# Altium integrated library chipfc_altium_libs.IntLib: 346 symbols (part 1 of 3) (continued)
## LM358
designator U?
Low Power Dual Operational Amplifiers
footprint DIP 8 (DIP IC (2.54mm), 8 pins)
footprint SOIC-8 (SOIC, 8-Leads, Body 5.0x4.0mm (max), Pitch 1.27mm, IPC Medium Density)
part A pins: 1 OutA, 2 A-, 3 A+, 4 GND hidden to GND, 8 VCC hidden to VCC
part B pins: 5 B+, 6 B-, 7 OutB

## LM2596S-5.0
designator U?
Simple Switcher 3A Step-Down Voltage Regulator
footprint TO-263-5 (D2-PAK, 6-Pads, Body 8.9x10.4mm (max), IPC Medium Density)
pins: 1 VIN, 2 Out, 3 GND, 4 FB, 5 ~{ON}/OFF, 6 PAD
text: ON/OFF

## LP2985-33DBVR
designator U?  PACKAGE: SOT23-5
IC REG LDO 3.3V 0.15A SOT23-5; TYPE: SMD
footprint SOT-23-5 (SOT23, 5-Leads, Body 3.0x3.0mm (max), Pitch 0.95mm, IPC Medium Density)
pins: 1 VIN, 2 GND, 3 EN, 4 NR/FB, 5 VOUT

## M95
designator U?
Quectel's Cellular Engine
footprint M95 (LCC, 54-Pins, Body 19.9x23.6mm (max), Pitch 1.10mm, IPC Medium Density)
footprint M95 2 (LCC, 54-Pins, Body 19.9x23.6mm (max), Pitch 1.10mm, IPC Medium Density)
pins: 1 AGND (power), 2 MIC2P (in), 3 MIC2N (in), 4 MIC1P (in), 5 MIC1N (in), 6 SPK1N (out), 7 SPK1P (out), 8 LOUDSPKN (out), 9 LOUDSPKP (out), 10 PWRKEY (in), 11 EMERG_OFF (in), 12 STATUS (out), 13 NETLIGHT (out), 14 DBG_RXD (in), 15 DBG_TXD (out), 16 RESERVED, 17 RESERVED, 18 RESERVED, 19 VDD_EXT (power), 20 DTR (in), 21 RXD (in), 22 TXD (out), 23 CTS (out), 24 RTS (in), 25 DCD (out), 26 RI (out), 27 SIM_VDD (power), 28 SIM_RST (out), 29 SIM_DATA (io), 30 SIM_CLK (out), 31 SIM_GND (power), 32 VRTC (power), 33 VBAT (power), 34 VBAT (power), 35 GND (power), 36 GND (power), 37 GND (power), 38 GND (power), 39 RF_ANT, 40 GND (power)

## MAX232
designator U?
RS-232 Line Driver/Receiver
footprint SOIC-16 (SOIC, 16-Leads, Body 10.0x4.0mm (max), Pitch 1.27mm, IPC Medium Density)
pins: 1 C1+, 2 V+, 3 C1-, 4 C2+, 5 C2-, 6 V-, 7 DOUT2, 8 RIN2, 9 ROUT2, 10 DIN2, 11 DIN1, 12 ROUT1, 13 RIN1, 14 DOUT1, 15 GND, 16 VCC

## MC34063A
designator U?
1.5A peak Boost/Buck/Inverting switching regulator
footprint SOIC-8 (SOIC, 8-Leads, Body 5.0x4.0mm (max), Pitch 1.27mm, IPC Medium Density)
pins: 1 SWC, 2 SWE, 3 TC, 4 GND, 5 COMP, 6 VCC, 7 SEN, 8 DVR

## MCP17xx
designator U?
pins: 1 GND (power), 2 VOUT (power), 3 VIN (power)

## MCP2021
designator U?, comment MCP2021(A)
LIN Transceiver with Voltage Regulator
footprint SOIC-8 (SOIC, 8-Leads, Body 5.0x4.0mm (max), Pitch 1.27mm, IPC Medium Density)
pins: 1 RXD (out), 2 CS/LWAKE (in), 3 VRegOut (power), 4 TXD (in), 5 VSS (power), 6 Lbus (io), 7 VBB (power), 8 ~{Fault}/TXE (io)

## MCP2515-SO
designator U?
Stand-Alone CAN Controller with SPI Interface
footprint SOIC-20 (SOIC, 20-Leads, Body 12.8x7.5mm (max), Pitch 1.27mm, IPC Medium Density)
pins: 1 TXCAN, 2 RXCAN, 3 CLKOUT/SOF, 4 ~{TX0RTS}, 5 ~{TX1RTS}, 6 ~{TX2RTS}, 7 OSC2, 8 OSC1, 9 VSS, 10 ~{RX1BF}, 11 ~{RX0BF}, 12 ~{INT}, 13 SCK, 14 SI, 15 SO, 16 ~{CS}, 17 ~{RESET}, 18 VDD

## MCP2551
designator U?
High-Speed CANTransceiver
footprint SOIC-8 (SOIC, 8-Leads, Body 5.0x4.0mm (max), Pitch 1.27mm, IPC Medium Density)
footprint DIP 8 (DIP IC (2.54mm), 8 pins)
pins: 1 TXD (in), 2 VSS (power), 3 VDD (power), 4 RXD (out), 5 Vref (out), 6 CANL (io), 7 CANH (io), 8 Rs (in)

## MCP9700
designator Q?, comment MCP9700A
Low-Power Linear Active Thermistor™ ICs
footprint TO-92
footprint SOT-23 (SOT23, 3-Leads, Body 3.0x2.5mm (max), Pitch 0.95mm, IPC Medium Density)
footprint TO-92/W100
pins: 1 VDD, 2 VOUT, 3 GND

## MCP73831/2
designator U?
Miniature Single-Cell, Fully Integrated Li-Ion, Li-Polymer Charge Management Controllers
footprint SOT-23-5 (SOT23, 5-Leads, Body 3.0x3.0mm (max), Pitch 0.95mm, IPC Medium Density)
pins: 1 Stat, 2 Vss, 3 Vbat, 4 Vdd, 5 Prog

## MIC29302WT
designator U?
3.0A LDO Regulator with ADJ. voltage output
footprint TO-263-5 (D2-PAK, 6-Pads, Body 8.9x10.4mm (max), IPC Medium Density)
pins: 1 EN, 2 IN, 3 GND, 4 OUT, 5 ADJ, 6 TAB(GND)

## MMA845xQ
designator U?
Freescale's 3-axis digital accelerometer
footprint MMA845xQ (QFN, 16-Leads, Body 3.0x3.0mm (max), Pitch 0.50mm, IPC Low Density)
pins: 1 VDDIO, 2 BYP, 4 SCL, 5 GND, 6 SDA, 7 SA0, 9 INT2, 10 GND, 11 INT1, 12 GND, 14 VDD

## MMA7260Q
designator U?
pins: 1 GS1, 2 GS2, 3 VDD (power), 4 VSS (power), 12 ~{SLP}, 13 Zout, 14 Yout, 15 Xout

## MMA7455L
designator U?
±2g/±4g/±8g Three Axis Low-g Digital Output Accelerometer
footprint LGA-14 (LCC, 14-Pins, Body 3.0x5.0mm (max), Pitch 0.80mm, IPC Medium Density)
pins: 1 DVDD, 2 GND, 3 NC, 4 IADDR0, 5 GND, 6 AVDD, 7 ~{CS}, 8 INT1/DRDY, 9 INT2, 10 NC, 11 NC, 12 SDO, 13 SDA/SDI/3WSDO, 14 SCL/SPC

## Mosfet N
designator Q?
footprint SOT-23 (SOT23, 3-Leads, Body 3.0x2.5mm (max), Pitch 0.95mm, IPC Medium Density)
footprint TO-220; pin to pad 2>3 3>2
footprint SOIC-8 (SOIC, 8-Leads, Body 5.0x4.0mm (max), Pitch 1.27mm, IPC Medium Density); pin to pad 1>4 2>1+2+3 3>5+6+7+8
footprint TO-220/HeatSink; pin to pad 2>3 3>2
footprint TO-252 (DPAK) (D-PAK, 3-Pads, Body 6.2x6.7mm (max), IPC Medium Density); pin to pad 2>3 3>2
footprint TO-263 (D2PAK); pin to pad 2>3 3>2
pins: 1 G, 2 S, 3 D

## Mosfet P
designator Q?
footprint SOT-23 (SOT23, 3-Leads, Body 3.0x2.5mm (max), Pitch 0.95mm, IPC Medium Density)
footprint TO-220; pin to pad 2>3 3>2
footprint TO-220/HeatSink; pin to pad 2>3 3>2
footprint SOIC-8 (SOIC, 8-Leads, Body 5.0x4.0mm (max), Pitch 1.27mm, IPC Medium Density); pin to pad 1>4 2>1+2+3 3>5+6+7+8
footprint TO-252 (DPAK) (D-PAK, 3-Pads, Body 6.2x6.7mm (max), IPC Medium Density); pin to pad 2>3 3>2
footprint TO-263 (D2PAK); pin to pad 2>3 3>2
pins: 1 G, 2 S, 3 D

## MPL115A2
designator U?
pins: 1 VDD, 2 CAP, 3 GND, 4 SHDN, 5 RST, 6 NC, 7 SDA, 8 SCL

## MPU-6050
designator U?
Accelerometer, Gyroscope, 6 Axis Sensor IÂ²C Output; MF: TDK InvenSense; Price: None; Package: VFQFN-24 TDK InvenSense; MP: MPU-6050; Value: *; Availability: Unavailable; SnapEDA_Link: https://www.snapeda.com/parts/MPU-6050/TDK%20InvenSense/view-part/4503180/?ref=snap
footprint QFN 50P 24 400X400X95
pins: 1 CLKIN (in), 6 AUX_DA (io), 7 AUX_CL (in), 8 VLOGIC (power), 9 AD0 (in), 10 REGOUT, 11 FSYNC (in), 12 INT (out), 13 VDD (power), 18 GND (power), 19 RESV@1, 20 CPOUT, 21 RESV@2, 22 RESV, 23 SCL (in), 24 SDA (io)

## MSP430F1612IPM
designator U?, comment MSP430F1612
footprint QFP 50P 64 (TSQFP, 64-Leads, Body 12.0x12.0mm (max), Pitch 0.50mm, IPC Medium Density)
pins: 1 DVCC (power), 2 P6.3/A3 (io), 3 P6.4/A4 (io), 4 P6.5/A5 (io), 5 P6.6/A6/DAC0 (io), 6 P6.7/A7/DAC1/ SVSIN (io), 7 VREF+ (out), 8 XIN (in), 9 XOUT (out), 10 VeREF+ (in), 11 VREF-/VeREF- (in), 12 P1.0/TACLK (io), 13 P1.1/TA0 (io), 14 P1.2/TA1 (io), 15 P1.3/TA2 (io), 16 P1.4/SMCLK (io), 17 P1.5/TA0 (io), 18 P1.6/TA1 (io), 19 P1.7/TA2 (io), 20 P2.0/ACLK (io), 21 P2.1/TAINCLK (io), 22 P2.2/CAOUT/TA0 (io), 23 P2.3/CA0/TA1 (io), 24 P2.4/CA1/TA2 (io), 25 P2.5/ROSC (io), 26 P2.6/ADC12CLK/ DMAE0 (io), 27 P2.7/TA0 (io), 28 P3.0/STE0 (io), 29 P3.1/SIMO0/SDA (io), 30 P3.2/SOMI0 (io), 31 P3.3/UCLK0/SCL (io), 32 P3.4/UTXD0 (io), 33 P3.5/URXD0 (io), 34 P3.6/UTXD1 (io), 35 P3.7/URXD1 (io), 36 P4.0/TB0 (io), 37 P4.1/TB1 (io), 38 P4.2/TB2 (io), 39 P4.3/TB3 (io), 40 P4.4/TB4 (io), 41 P4.5/TB5 (io), 42 P4.6/TB6 (io), 43 P4.7/TBCLK (io), 44 P5.0/STE1 (io), 45 P5.1/SIMO1 (io), 46 P5.2/SOMI1 (io), 47 P5.3/UCLK1 (io), 48 P5.4/MCLK (io), 49 P5.5/SMCLK (io), 50 P5.6/ACLK (io), 51 P5.7/TBOUTH/ SVSOUT (io), 52 XT2OUT (out), 53 XT2IN (in), 54 TDO/TDI (io), 55 TDI (in), 56 TMS (in), 57 TCK (in), 58 ~{RST}/NMI (in), 59 P6.0/A0 (io), 60 P6.1/A1 (io), 61 P6.2/A2 (io), 62 AVSS (power), 63 DVSS (power), 64 AVCC (power)

## MSP430F2618TPMR
designator U?
footprint QFP 50P 64 (TSQFP, 64-Leads, Body 12.0x12.0mm (max), Pitch 0.50mm, IPC Medium Density)
pins: 1 DVCC (power), 2 P6.3/A3 (io), 3 P6.4/A4 (io), 4 P6.5/A5 (io), 5 P6.6/A6 (io), 6 P6.7/A7/SVSIN (io), 7 VREF+ (out), 8 XIN (in), 9 XOUT (out), 10 VeREF+/DAC0 (in), 11 VREF-/VeREF- (in), 12 P1.0/TACLK/CAOUT (io), 13 P1.1/TA0 (io), 14 P1.2/TA1 (io), 15 P1.3/TA2 (io), 16 P1.4/SMCLK (io), 17 P1.5/TA0 (io), 18 P1.6/TA1 (io), 19 P1.7/TA2 (io), 20 P2.0/ACLK/CA2 (io), 21 P2.1/TAINCLK/CA3 (io), 22 P2.2/CAOUT/TA0/CA4 (io), 23 P2.3/CA0/TA1 (io), 24 P2.4/CA1/TA2 (io), 25 P2.5/ROSC/CA5 (io), 26 P2.6/ADC12CLK/CA6 (io), 27 P2.7/TA0/CA7 (io), 28 P3.0/UCB0STE/UCA0CLK (io), 29 P3.1/UCB0SIMO/UCB0SDA (io), 30 P3.2/UCB0SOMI/UCB0SCL (io), 31 P3.3/UCB0CLK/UCA0STE (io), 32 P3.4/UCA0TXD/UCA0SIMO (io), 33 P3.5/UCA0RXD/UCA0SOMI (io), 34 P3.6/UCA1TXD/UCA1SIMO (io), 35 P3.7/UCA1RXD/UCA1SOMI (io), 36 P4.0/TB0 (io), 37 P4.1/TB1 (io), 38 P4.2/TB2 (io), 39 P4.3/TB3 (io), 40 P4.4/TB4 (io), 41 P4.5/TB5 (io), 42 P4.6/TB6 (io), 43 P4.7/TBCLK (io), 44 P5.0/UCB1STE/UCA1CLK (io), 45 P5.1/UCB1SIMO/UCB1SDA (io), 46 P5.2/UCB1SOMI/UCB1SCL (io), 47 P5.3/UCB1CLK/UCA1STE (io), 48 P5.4/MCLK (io), 49 P5.5/SMCLK (io), 50 P5.6/ACLK (io), 51 P5.7/TBOUTH/SVSOUT (io), 52 XT2OUT (out), 53 XT2IN (in), 54 TDO/TDI (io), 55 TDI/TCLK (in), 56 TMS (in), 57 TCK (in), 58 ~{RST}/NMI (in), 59 P6.0/A0 (io), 60 P6.1/A1 (io), 61 P6.2/A2 (io), 62 AVSS (power), 63 DVSS (power), 64 AVCC (power)

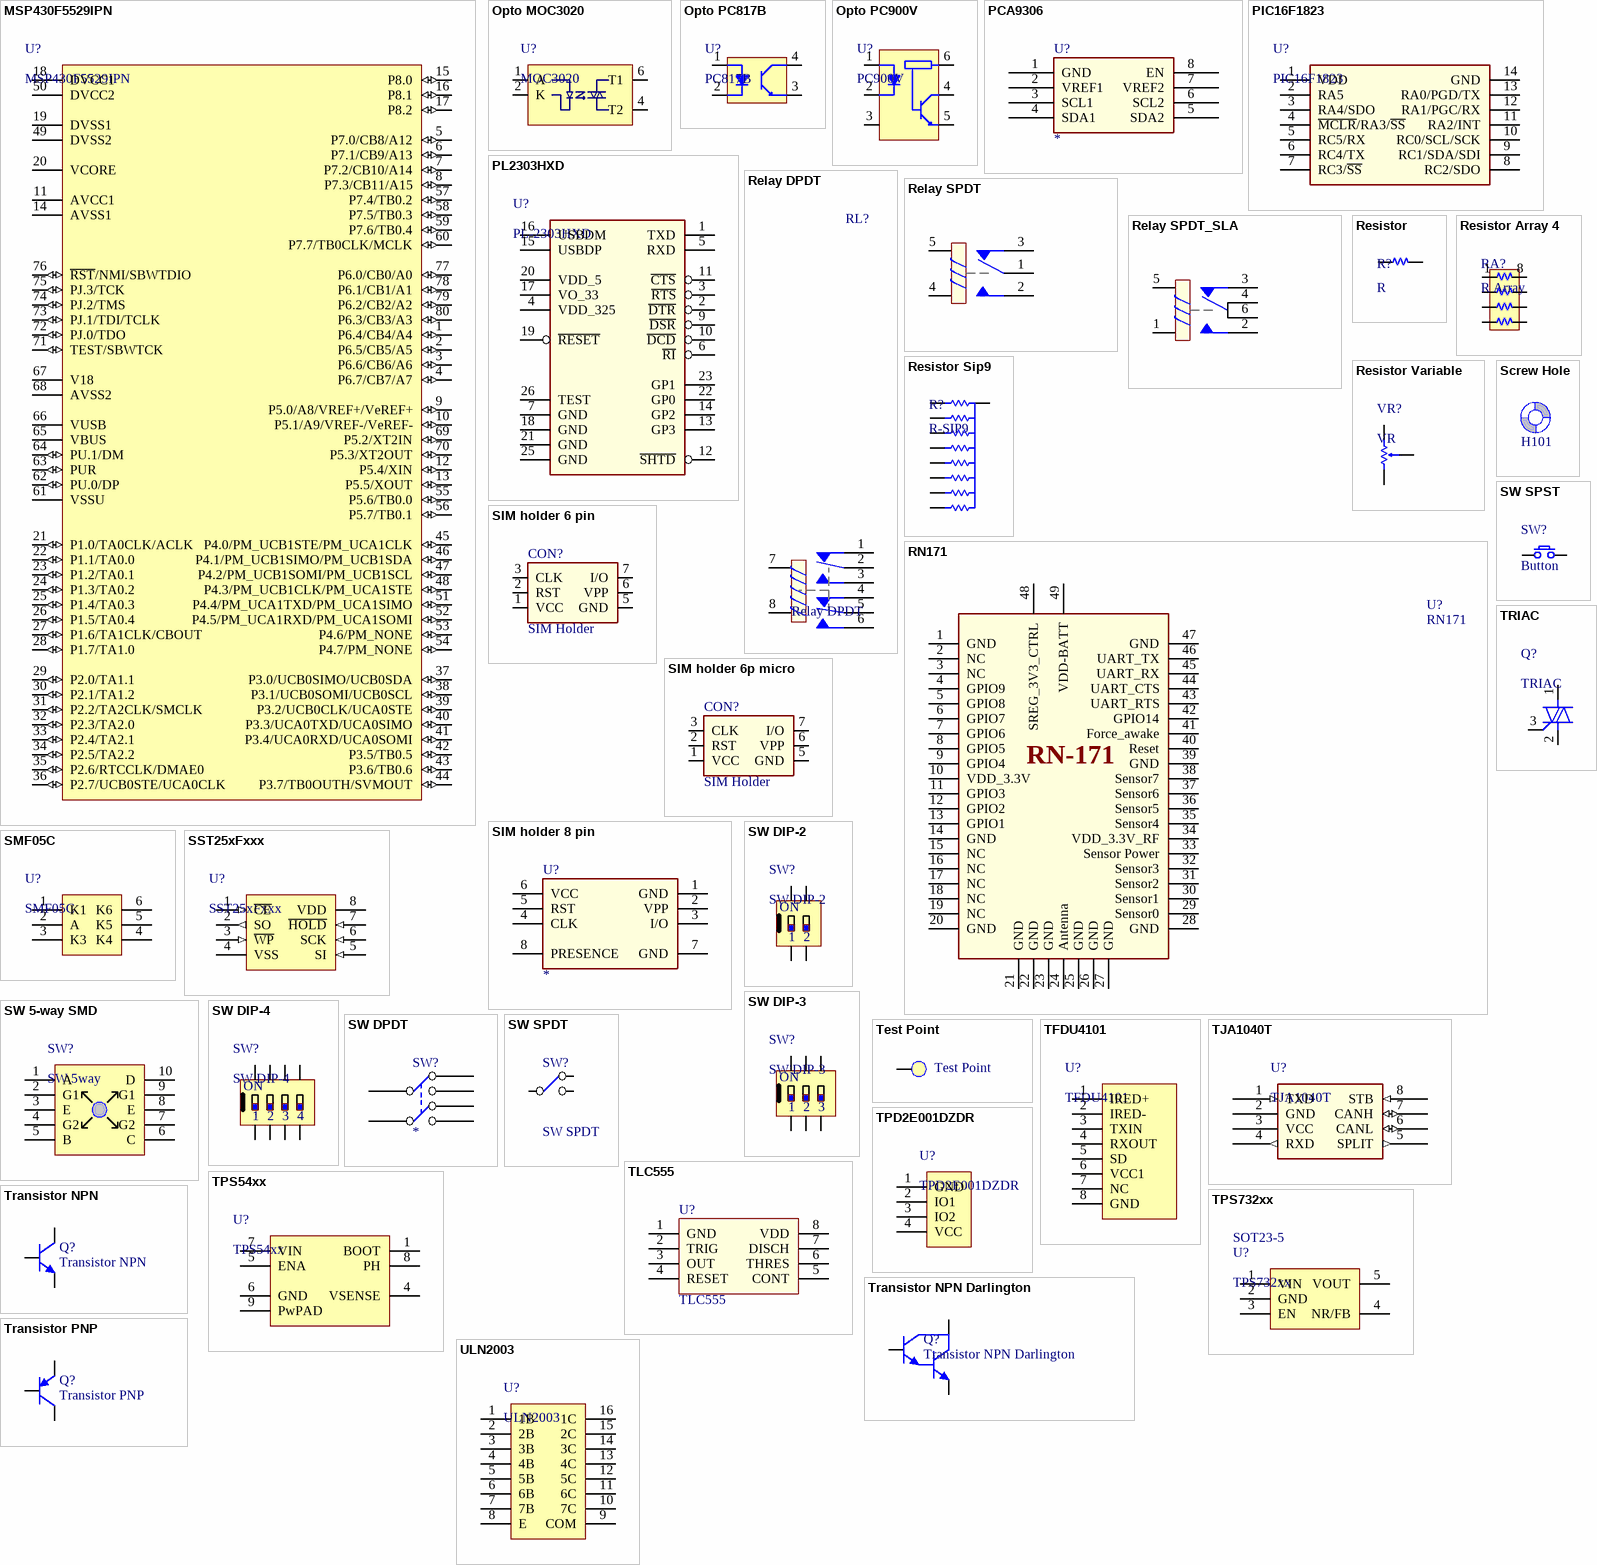
[diagram p3: symbols MSP430F5529IPN to ULN2003]

## MSP430F5529IPN
designator U?
footprint QFP 50P 80 (TSQFP, 80-Leads, Body 14.2x14.2mm (max), Pitch 0.50mm, IPC Medium Density)
pins: 1 P6.4/CB4/A4 (io), 2 P6.5/CB5/A5 (io), 3 P6.6/CB6/A6 (io), 4 P6.7/CB7/A7 (io), 5 P7.0/CB8/A12 (io), 6 P7.1/CB9/A13 (io), 7 P7.2/CB10/A14 (io), 8 P7.3/CB11/A15 (io), 9 P5.0/A8/VREF+/VeREF+ (io), 10 P5.1/A9/VREF-/VeREF- (io), 11 AVCC1 (power), 12 P5.4/XIN (io), 13 P5.5/XOUT (io), 14 AVSS1 (power), 15 P8.0 (io), 16 P8.1 (io), 17 P8.2 (io), 18 DVCC1 (power), 19 DVSS1 (power), 20 VCORE (power), 21 P1.0/TA0CLK/ACLK (io), 22 P1.1/TA0.0 (io), 23 P1.2/TA0.1 (io), 24 P1.3/TA0.2 (io), 25 P1.4/TA0.3 (io), 26 P1.5/TA0.4 (io), 27 P1.6/TA1CLK/CBOUT (io), 28 P1.7/TA1.0 (io), 29 P2.0/TA1.1 (io), 30 P2.1/TA1.2 (io), 31 P2.2/TA2CLK/SMCLK (io), 32 P2.3/TA2.0 (io), 33 P2.4/TA2.1 (io), 34 P2.5/TA2.2 (io), 35 P2.6/RTCCLK/DMAE0 (io), 36 P2.7/UCB0STE/UCA0CLK (io), 37 P3.0/UCB0SIMO/UCB0SDA (io), 38 P3.1/UCB0SOMI/UCB0SCL (io), 39 P3.2/UCB0CLK/UCA0STE (io), 40 P3.3/UCA0TXD/UCA0SIMO (io), 41 P3.4/UCA0RXD/UCA0SOMI (io), 42 P3.5/TB0.5 (io), 43 P3.6/TB0.6 (io), 44 P3.7/TB0OUTH/SVMOUT (io), 45 P4.0/PM_UCB1STE/PM_UCA1CLK (io), 46 P4.1/PM_UCB1SIMO/PM_UCB1SDA (io), 47 P4.2/PM_UCB1SOMI/PM_UCB1SCL (io), 48 P4.3/PM_UCB1CLK/PM_UCA1STE (io), 49 DVSS2 (power), 50 DVCC2 (power), 51 P4.4/PM_UCA1TXD/PM_UCA1SIMO (io), 52 P4.5/PM_UCA1RXD/PM_UCA1SOMI (io), 53 P4.6/PM_NONE (io), 54 P4.7/PM_NONE (io), 55 P5.6/TB0.0 (io), 56 P5.7/TB0.1 (io), 57 P7.4/TB0.2 (io), 58 P7.5/TB0.3 (io), 59 P7.6/TB0.4 (io), 60 P7.7/TB0CLK/MCLK (io), 61 VSSU (power), 62 PU.0/DP (io), 63 PUR (io), 64 PU.1/DM (io), 65 VBUS (power), 66 VUSB (power), 67 V18 (power), 68 AVSS2 (power), 69 P5.2/XT2IN (io), 70 P5.3/XT2OUT (io), 71 TEST/SBWTCK (io), 72 PJ.0/TDO (io), 73 PJ.1/TDI/TCLK (io), 74 PJ.2/TMS (io), 75 PJ.3/TCK (io), 76 ~{RST}/NMI/SBWTDIO (io), 77 P6.0/CB0/A0 (io), 78 P6.1/CB1/A1 (io), 79 P6.2/CB2/A2 (io), 80 P6.3/CB3/A3 (io)

## Opto MOC3020
designator U?, comment MOC3020
6-Pin DIP Random-Phase Optoisolators Triac Driver Output (250/400 Volt Peak)
footprint DIP 6 (DIP IC (2.54mm), 6 pins)
pins: 1 A, 2 K, 3 NC hidden, 4 T2, 5 NC hidden, 6 T1

## Opto PC817B
designator U?, comment PC817B
footprint DIP 4 (DIP IC (2.54mm), 4 pins)
pins: 1 A, 2 K, 3 E, 4 C

## Opto PC900V
designator U?, comment PC900V
footprint DIP 6 (DIP IC (2.54mm), 6 pins)
pins: 1 A, 2 K, 3 E, 4 C, 5 C, 6 C

## PCA9306
designator U?
pins: 1 GND, 2 VREF1, 3 SCL1, 4 SDA1, 5 SDA2, 6 SCL2, 7 VREF2, 8 EN

## PIC16F1823
designator U?
PIC16(L)F1823
footprint DIP 14
footprint SOIC-14 (SOIC, 14-Leads, Body 8.6x3.9mm (max), Pitch 1.27mm, IPC Medium Density)
pins: 1 VDD, 2 RA5, 3 RA4/SDO, 4 ~{MCLR}/RA3/~{SS}, 5 RC5/RX, 6 RC4/TX, 7 RC3/~{SS}, 8 RC2/SDO, 9 RC1/SDA/SDI, 10 RC0/SCL/SCK, 11 RA2/INT, 12 RA1/PGC/RX, 13 RA0/PGD/TX, 14 GND

## PL2303HXD
designator U?, comment PL-2303HXD
USB to Serial Bridge Controller
footprint TSSOP 28 65P (SOP, 28-Leads, Body 10.5x5.6mm (max), Pitch 0.65mm, IPC Medium Density)
pins: 1 TXD, 2 ~{DTR}, 3 ~{RTS}, 4 VDD_325, 5 RXD, 6 ~{RI}, 7 GND (power), 9 ~{DSR}, 10 ~{DCD}, 11 ~{CTS}, 12 ~{SHTD}, 13 GP3, 14 GP2, 15 USBDP, 16 USBDM, 17 VO_33, 18 GND (power), 19 ~{RESET}, 20 VDD_5 (power), 21 GND (power), 22 GP0, 23 GP1, 25 GND, 26 TEST, 27 NC hidden, 28 RESERVED hidden

## Relay DPDT
designator RL?
footprint RL_DPDT_1A (Reley DPDT, 8 pin, 1A, W400mil, L800mil,H 300mil)
footprint RL_DPDT_5A (Reley DPDT, 8 pin, 5A, W500mil, L1100mil,H 950mil)
pins: 1, 2, 3, 4, 5, 6, 7, 8

## Relay SPDT
designator RL?
footprint RL_SPDT_10A (Relay SPDT, 5 pin, 10A,W 650mil, L 800mil, H 800mil)
footprint RL_SPDT_20A_SMALL
footprint RL_SPDT_MIX
pins: 1 COM, 2 NO, 3 NC, 4 COIL1, 5 COIL2

## Relay SPDT_SLA
designator RL?, comment SLA-xxVDC-SL-C
footprint RL_SPDT_30A (Relay SPDT, 5 pin, 10A,W 650mil, L 800mil, H 800mil)
pins: 1 COIL1, 2 NO, 3 NC, 4 COM, 5 COIL2, 6 COM

## Resistor
designator R?, comment R
Resistor
footprint R 1W (Through hole resitor, axial 600mils, 1W)
footprint R 5W
footprint R 0402 (Chip Resistor, 2-Leads, Body 1.0x0.5mm, IPC Medium Density)
footprint R 0603 (Chip Resistor, 2-Leads, Body 1.6x0.8mm, IPC Medium Density)
footprint R 0805 (Chip Resistor, 2-Leads, Body 2.0x1.3mm, IPC Medium Density)
footprint R 1206 (Chip Resistor, 2-Leads, Body 3.1x1.6mm, IPC Medium Density)
footprint R 1210 (Chip Resistor, 2-Leads, Body 3.2x2.5mm, IPC Medium Density)
footprint R 1812 (Chip Resistor, 2-Leads, Body 4.5x3.2mm, IPC Medium Density)
footprint R 2010 (Chip Resistor, 2-Leads, Body 5.0x2.5mm, IPC Medium Density)
footprint R 2512 (Chip Resistor, 2-Leads, Body 6.4x3.2mm, IPC Medium Density)
footprint R 1/2W/630 (Through hole resitor, axial 600mils, 1W)
footprint R 1/4W/300 (Through hole resitor, axial 300mils, 1/4W)
footprint R 1W/500 (Through hole resitor, axial 500mils, 1W)
footprint RR 0402 (Chip Capacitor, 2-Leads, Body 1.0x0.5mm, IPC Medium Density)
footprint RES_1W_V (PANASONIC)
footprint R 0402 (1005) (Chip Resistor, 2-Leads, Body 1.0x0.5mm, IPC Medium Density)
pins: 1, 2

## Resistor Array 4
designator RA?, comment R Array
Resistor Array 4
footprint RA4 1206 (3216) (Resistor Array x4 1206 (4D03))
pins: 1, 2, 3, 4, 5, 6, 7, 8

## Resistor Sip9
designator R?, comment R-SIP9
Resistor
footprint R SIP9
pins: 1, 2, 3, 4, 5, 6, 7, 8, 9

## Resistor Variable
designator VR?, comment VR
Resistor Variable
footprint R VAR A
footprint R VAR B
footprint R VAR C
footprint R VAR D
footprint R VAR A 3D
footprint R Var Volum
footprint R Var Volum right
footprint R Var 3mm
footprint R VAR E
pins: 1, 2, 3

## RN171
designator U?
RN-171 802.11 b/g Wireless LAN Module
footprint RN171 (RN-171 802.11 b/g Wireless LAN Module)
pins: 1 GND, 2 NC, 3 NC, 4 GPIO9, 5 GPIO8, 6 GPIO7, 7 GPIO6, 8 GPIO5, 9 GPIO4, 10 VDD_3.3V, 11 GPIO3, 12 GPIO2, 13 GPIO1, 14 GND, 15 NC, 16 NC, 17 NC, 18 NC, 19 NC, 20 GND, 21 GND, 22 GND, 23 GND, 24 Antenna, 25 GND, 26 GND, 27 GND, 28 GND, 29 Sensor0 (power), 30 Sensor1 (power), 31 Sensor2 (power), 32 Sensor3 (power), 33 Sensor Power, 34 VDD_3.3V_RF, 35 Sensor4, 36 Sensor5, 37 Sensor6, 38 Sensor7, 39 GND (power), 40 Reset, 41 Force_awake, 42 GPIO14, 43 UART_RTS, 44 UART_CTS, 45 UART_RX (power), 46 UART_TX (power), 47 GND, 48 SREG_3V3_CTRL, 49 VDD-BATT
text: RN-171

## Screw Hole
designator H101  (value not drawn)  (no BOM)
TYPE: NO-BOM; UNIT PRICE: 0
footprint SCREW/3.2/7.0/M
footprint SCREW/3.0/6.0
footprint SCREW/2.8/5.0
pins: 1 Screw

## SIM holder 6 pin
designator CON?, comment SIM Holder
SIM Card holder, 6 pins
footprint CON SIM Holder C707 (SIM Holder,  6 pins)
footprint CON SIM Holder FMS006-2600 (SIM Holder,  6 pins)
footprint CON SIM Holder 47548 (Molex's SIM Holder,  6 pins)
footprint CON SIM Holder I9000 (Molex's SIM Holder,  6 pins)
footprint CON SIM Micro 6P PUSH (SIM Holder,  6 pins)
pins: 1 VCC (power), 2 RST, 3 CLK, 5 GND (power), 6 VPP, 7 I/O

## SIM holder 6p micro
designator CON?, comment SIM Holder
SIM Card holder, 6 pins
footprint CON SIM Micro 6P PUSH (SIM Holder,  6 pins)
pins: 1 VCC (power), 2 RST, 3 CLK, 5 GND (power), 6 VPP, 7 I/O, 20 SHIELD

## SIM holder 8 pin
designator U?
pins: 1 GND (power), 2 VPP, 3 I/O, 4 CLK, 5 RST, 6 VCC (power), 7 GND (power), 8 PRESENCE

## SMF05C
designator U?
5-Line Transient Voltage Suppressor Array
footprint SOT-363-6 (SOT363 (SC-88, SC-70-6), 6-Leads, Body 2.2x2.2mm (max), Pitch 0.65mm, IPC Medium Density)
pins: 1 K1, 2 A, 3 K3, 4 K4, 5 K5, 6 K6

## SST25xFxxx
designator U?
Microchip's Serial Flash
footprint SOIC-8 (SOIC, 8-Leads, Body 5.0x4.0mm (max), Pitch 1.27mm, IPC Medium Density)
pins: 1 ~{CE} (in), 2 SO (out), 3 ~{WP} (in), 4 VSS (power), 5 SI (in), 6 SCK (in), 7 ~{HOLD} (in), 8 VDD (power)

## SW 5-way SMD
designator SW?, comment SW 5way
5-way tact SW, SMD Package
footprint SW 5-WAY SMD
footprint SW 5-WAY SMD 2
pins: 1 A, 2 G1, 3 E, 4 G2, 5 B, 6 C, 7 G2, 8 E, 9 G1, 10 D

## SW DIP-2
designator SW?
footprint SW/DIP2
pins: 1, 2, 3, 4
text: ON

## SW DIP-3
designator SW?
footprint SW/DIP3
pins: 1, 2, 3, 4, 5, 6
text: ON

## SW DIP-4
designator SW?
footprint SW/DIP4
pins: 1, 2, 3, 4, 5, 6, 7, 8
text: ON

## SW DPDT
designator SW?
footprint SW/DPDT/10MM
pins: 1 NC1, 2 COMMON1, 3 NO1, 4 NC2, 5 COMMON2, 6 NO2

## SW SPDT
designator SW?
footprint SW/3/SPDT/POWER
footprint SW/5/SPDT/MEDIUM
footprint SW/5/SPDT/SMALL
footprint SW/3/SPDT/SS12D10
footprint SW/3/SPDT/SS12D06
pins: 1 NC1, 2 COMMON1, 3 NO1

## SW SPST
designator SW?, comment Button
Tact switch 2 pin
footprint SW/2/DIP
footprint SW/2/SMD
footprint SW/2/SMD/Micro
footprint SW/4/SMD
footprint SW/2/DIP/Edge/4.5mm
footprint SW/4/SMD/XS
pins: 1, 2

## Test Point
designator 3V3  (no BOM)
TYPE: NO-BOM; UNIT PRICE: 0
footprint TESTPOINT/1/Black
footprint TESTPOINT/1/Blue
footprint TESTPOINT/1/Brown
footprint TESTPOINT/1/Gray
footprint TESTPOINT/1/Green
footprint TESTPOINT/1/Orange
footprint TESTPOINT/1/Red
footprint TESTPOINT/1/Violet
footprint TESTPOINT/1/White
footprint TESTPOINT/1/Yellow
footprint TestPoint/DIP
footprint TestPoint/SMD/1.5mm
pins: 1 TP

## TFDU4101
designator U?
Infrared Transceiver Module (SIR, 115.2 kbit/s) for IrDA®  Applications
pins: 1 IRED+, 2 IRED-, 3 TXIN, 4 RXOUT, 5 SD, 6 VCC1, 7 NC, 8 GND

## TJA1040T
designator U?
High speed CAN transceiver, compatible with 3.3 V and 5 V devices
footprint SOIC-8 (SOIC, 8-Leads, Body 5.0x4.0mm (max), Pitch 1.27mm, IPC Medium Density)
pins: 1 TXD (in), 2 GND (power), 3 VCC (power), 4 RXD (out), 5 SPLIT (out), 6 CANL (io), 7 CANH (io), 8 STB (in)

## TLC555
designator U?
TLC555 LinCMOS™ Timer
footprint SOIC-8 (SOIC, 8-Leads, Body 5.0x4.0mm (max), Pitch 1.27mm, IPC Medium Density)
footprint DIP 8 (DIP IC (2.54mm), 8 pins)
pins: 1 GND, 2 TRIG, 3 OUT, 4 RESET, 5 CONT, 6 THRES, 7 DISCH, 8 VDD

## TPD2E001DZDR
designator U?
Low-capacitance 2 channel ±15kV ESD protection array for high-speed data interfaces
footprint SOT-143B (SOT143, 4-Leads, Body 3.0x2.6mm (max), Pitch 1.92mm, IPC Medium Density)
pins: 1 GND, 2 IO1, 3 IO2, 4 VCC

## TPS54xx
designator U?
3/5A, Wide input range, Step-down SWIFT DC-DC Converter
footprint SOIC-8 EP (SOIC, 8-Leads, Body 5.0x4.0mm (max), Pitch 1.27mm, IPC Medium Density)
pins: 1 BOOT, 4 VSENSE, 5 ENA, 6 GND, 7 VIN, 8 PH, 9 PwPAD

## TPS732xx
designator U?  PACKAGE: SOT23-5
IC REG LDO 3.3V 0.15A SOT23-5; TYPE: SMD
footprint SOT-23-5 (SOT23, 5-Leads, Body 3.0x3.0mm (max), Pitch 0.95mm, IPC Medium Density)
pins: 1 VIN, 2 GND, 3 EN, 4 NR/FB, 5 VOUT

## Transistor NPN
designator Q?
NPN Bipolar Transistor
footprint TO-92; pin to pad 1>3 2>1 3>2
footprint SOT-23 (SOT23, 3-Leads, Body 3.0x2.5mm (max), Pitch 0.95mm, IPC Medium Density)
footprint TO-126; pin to pad 1>3 2>1 3>2
footprint TO-92/W100; pin to pad 1>3 2>1 3>2
pins: 1 B, 2 E, 3 C

## Transistor NPN Darlington
designator Q?
NPN Darlington Transistor
footprint TO-220
pins: 1 B, 2 E, 3 C

## Transistor PNP
designator Q?
PNP Bipolar Transistor
footprint TO-92; pin to pad 1>3 2>1 3>2
footprint SOT-23 (SOT23, 3-Leads, Body 3.0x2.5mm (max), Pitch 0.95mm, IPC Medium Density)
footprint TO-92/W100; pin to pad 1>3 2>1 3>2
pins: 1 B, 2 E, 3 C

## TRIAC
designator Q?
footprint TO-220
pins: 1 A1, 2 A2, 3 G

## ULN2003
designator U?
High-voltage, high-current Darlington transistor arrays
footprint SOIC-16 (SOIC, 16-Leads, Body 10.0x4.0mm (max), Pitch 1.27mm, IPC Medium Density)
pins: 1 1B, 2 2B, 3 3B, 4 4B, 5 5B, 6 6B, 7 7B, 8 E, 9 COM, 10 7C, 11 6C, 12 5C, 13 4C, 14 3C, 15 2C, 16 1C

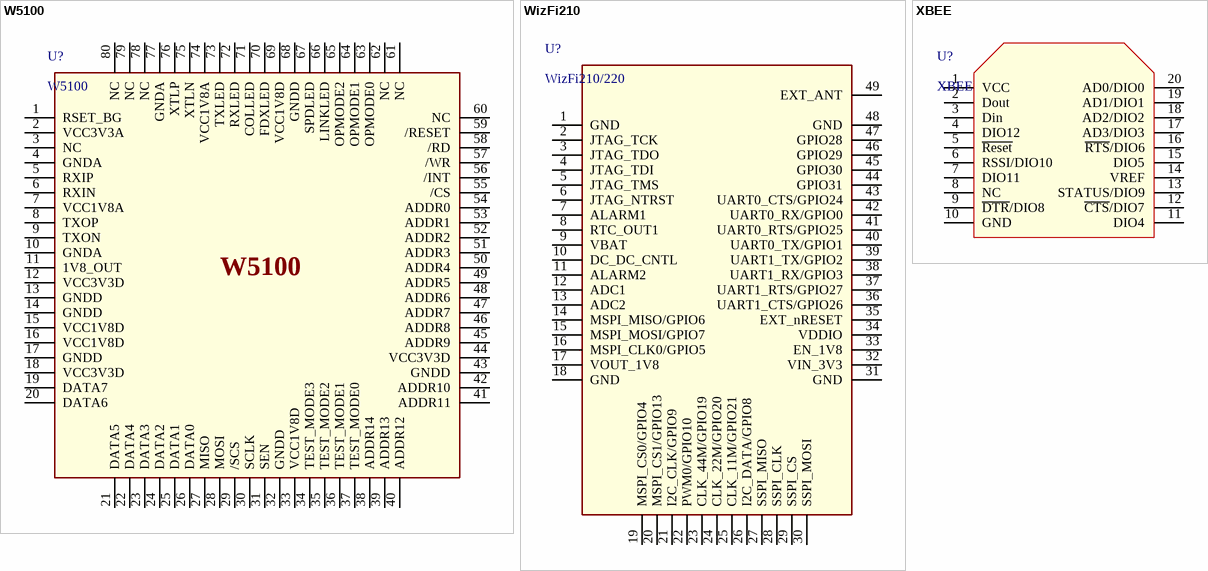
[diagram p4: symbols W5100 to XBEE]

## W5100
designator U?
Single-chip Internet-enabled 10/100 Ethernet controller
footprint QFP 40P 80 (TSQFP, 80-Leads, Body 12.0x12.0mm (max), Pitch 0.40mm, IPC Medium Density)
pins: 1 RSET_BG, 2 VCC3V3A, 3 NC, 4 GNDA, 5 RXIP, 6 RXIN, 7 VCC1V8A, 8 TXOP, 9 TXON, 10 GNDA, 11 1V8_OUT, 12 VCC3V3D, 13 GNDD, 14 GNDD, 15 VCC1V8D, 16 VCC1V8D, 17 GNDD, 18 VCC3V3D (power), 19 DATA7 (power), 20 DATA6, 21 DATA5, 22 DATA4, 23 DATA3, 24 DATA2, 25 DATA1, 26 DATA0, 27 MISO, 28 MOSI, 29 /SCS (power), 30 SCLK, 31 SEN, 32 GNDD, 33 VCC1V8D, 34 TEST_MODE3, 35 TEST_MODE2, 36 TEST_MODE1, 37 TEST_MODE0, 38 ADDR14, 39 ADDR13 (power), 40 ADDR12, 41 ADDR11, 42 ADDR10, 43 GNDD, 44 VCC3V3D, 45 ADDR9 (power), 46 ADDR8 (power), 47 ADDR7, 48 ADDR6, 49 ADDR5, 50 ADDR4, 51 ADDR3, 52 ADDR2, 53 ADDR1 (power), 54 ADDR0 (power), 55 /CS (power), 56 /INT (power), 57 /WR (power), 58 /RD (power), 59 /RESET (power), 60 NC, 61 NC (power), 62 NC (power), 63 OPMODE0 (power), 64 OPMODE1 (power), 65 OPMODE2 (power), 66 LINKLED, 67 SPDLED, 68 GNDD, 69 VCC1V8D (power), 70 FDXLED (power), 71 COLLED (power), 72 RXLED (power), 73 TXLED (power), 74 VCC1V8A, 75 XTLN, 76 XTLP, 77 GNDA, 78 NC, 79 NC, 80 NC

## WizFi210
designator U?, comment WizFi210/220
WIZnet's Serial to WiFi module
footprint WizFi210 (WIZnet's Serial to WiFi module)
pins: 1 GND, 2 JTAG_TCK, 3 JTAG_TDO, 4 JTAG_TDI, 5 JTAG_TMS, 6 JTAG_NTRST, 7 ALARM1, 8 RTC_OUT1, 9 VBAT, 10 DC_DC_CNTL, 11 ALARM2, 12 ADC1, 13 ADC2, 14 MSPI_MISO/GPIO6, 15 MSPI_MOSI/GPIO7, 16 MSPI_CLK0/GPIO5, 17 VOUT_1V8, 18 GND, 19 MSPI_CS0/GPIO4, 20 MSPI_CS1/GPIO13, 21 I2C_CLK/GPIO9, 22 PWM0/GPIO10, 23 CLK_44M/GPIO19, 24 CLK_22M/GPIO20, 25 CLK_11M/GPIO21, 26 I2C_DATA/GPIO8, 27 SSPI_MISO, 28 SSPI_CLK, 29 SSPI_CS, 30 SSPI_MOSI (power), 31 GND (power), 32 VIN_3V3 (power), 33 EN_1V8 (power), 34 VDDIO, 35 EXT_nRESET, 36 UART1_CTS/GPIO26, 37 UART1_RTS/GPIO27, 38 UART1_RX/GPIO3, 39 UART1_TX/GPIO2, 40 UART0_TX/GPIO1 (power), 41 UART0_RTS/GPIO25, 42 UART0_RX/GPIO0, 43 UART0_CTS/GPIO24, 44 GPIO31, 45 GPIO30, 46 GPIO29 (power), 47 GPIO28 (power), 48 GND, 49 EXT_ANT

## XBEE
designator U?
XBEE Module
footprint XBEE
footprint XBEE Pro
pins: 1 VCC, 2 Dout, 3 Din, 4 DIO12, 5 ~{Reset}, 6 RSSI/DIO10, 7 DIO11, 8 NC, 9 ~{DTR}/DIO8, 10 GND, 11 DIO4, 12 ~{CTS}/DIO7, 13 STATUS/DIO9, 14 VREF, 15 DIO5, 16 ~{RTS}/DIO6, 17 AD3/DIO3, 18 AD2/DIO2, 19 AD1/DIO1, 20 AD0/DIO0


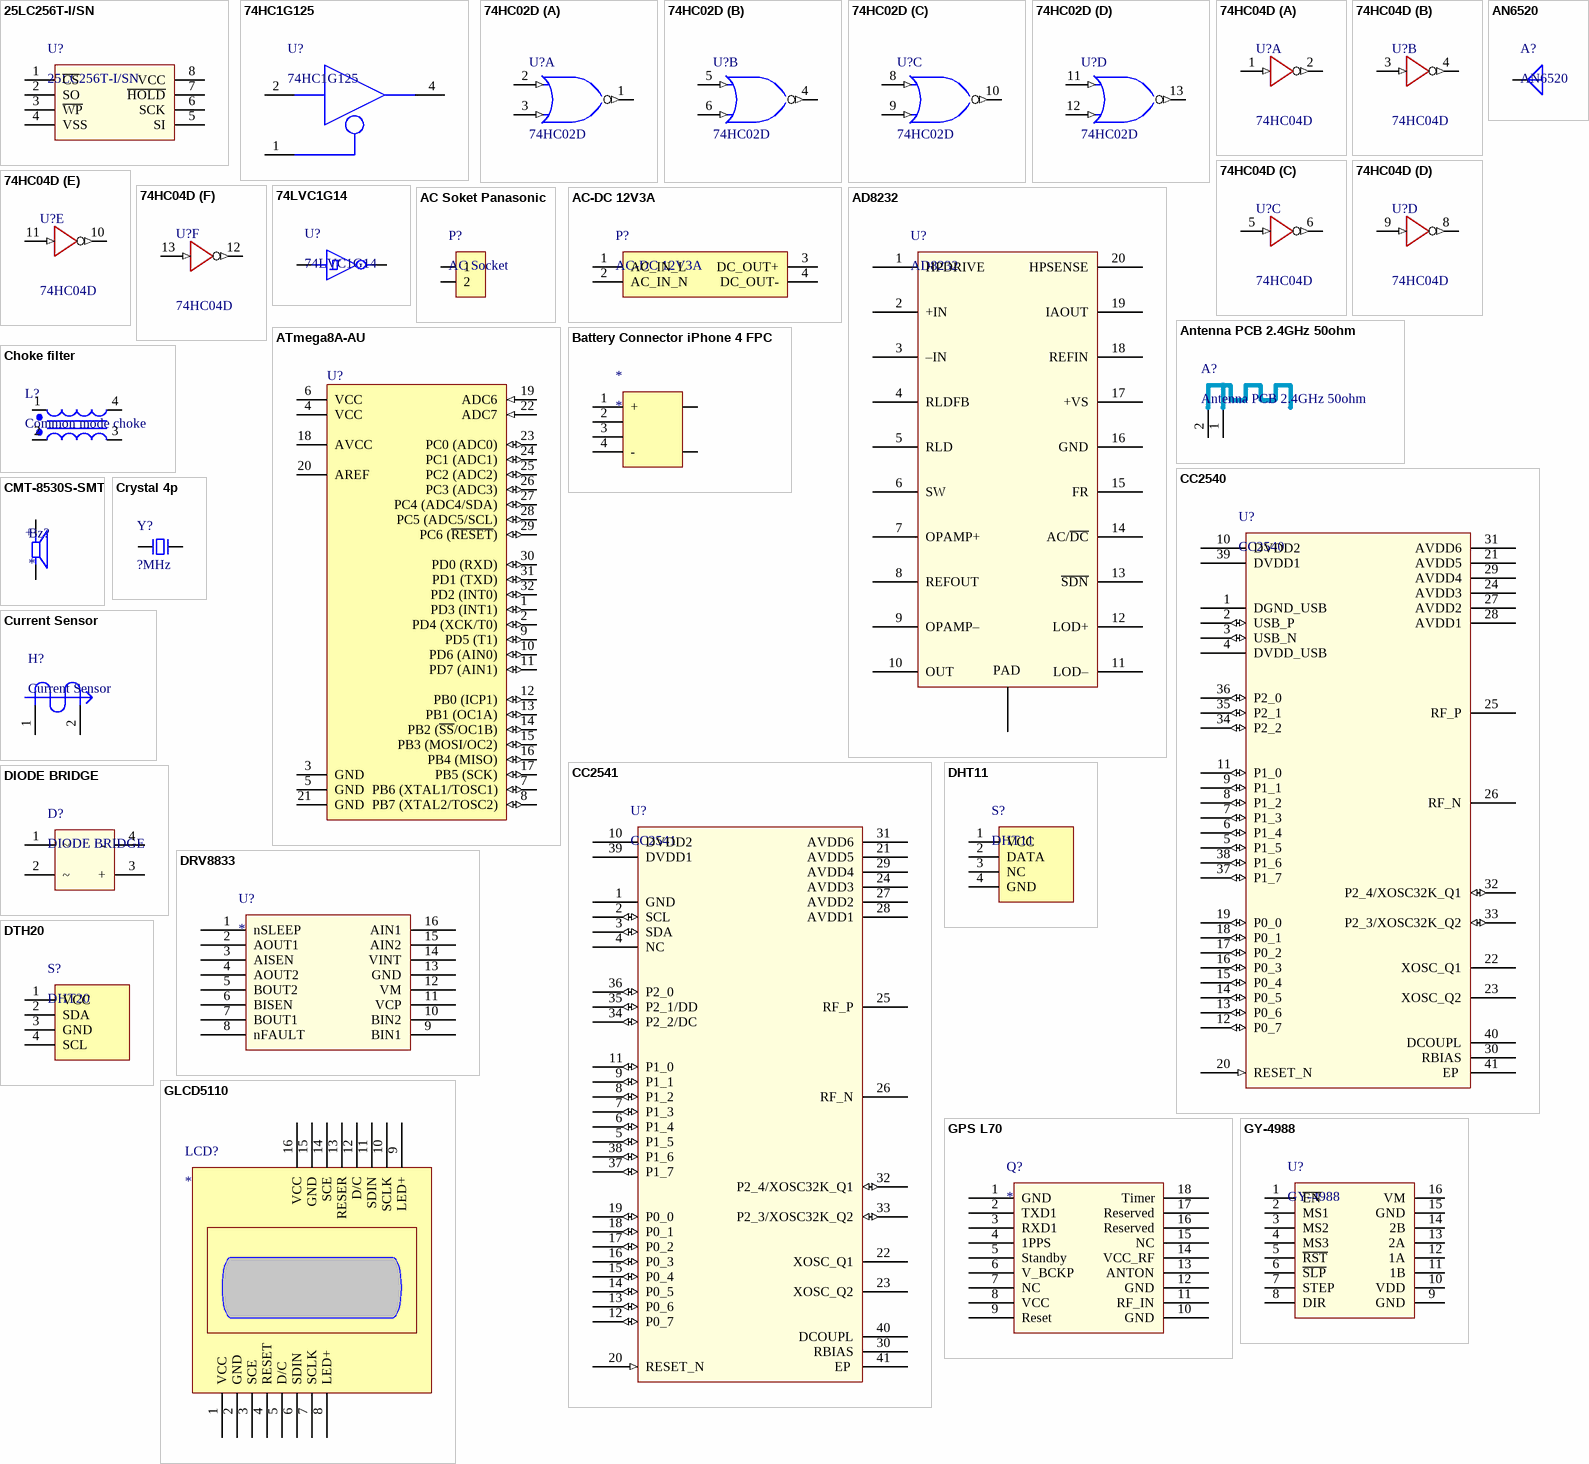
[diagram p5: symbols 25LC256T-I/SN to GY-4988]

## 25LC256T-I/SN
designator U?
IC EEPROM 256K SPI 10MHZ 8SOIC
footprint SOIC-8-I/SN (SOIC, 8-Leads, Body 5.0x4.0mm (max), Pitch 1.27mm, IPC Medium Density)
pins: 1 ~{CS}, 2 SO, 3 ~{WP} (power), 4 VSS, 5 SI, 6 SCK, 7 ~{HOLD}, 8 VCC

## 74HC1G125
designator U?
footprint TSSOP5
pins: 1 ~{OE}, 2 A, 3 GND (power) hidden to GND, 4 Y, 5 VCC (power) hidden to VCC

## 74HC02D
designator U?
Quadruple 2-Input Positive-NOR Gate
footprint SOIC-14 (SOIC, 14-Leads, Body 8.6x3.9mm (max), Pitch 1.27mm, IPC Medium Density)
pins on every part: 7 GND (power) hidden to GND, 14 VCC (power) hidden to VCC
part A pins: 1 Y (out), 2 A (in), 3 B (in)
part B pins: 4 Y (out), 5 A (in), 6 B (in)
part C pins: 8 A (in), 9 B (in), 10 Y (out)
part D pins: 11 A (in), 12 B (in), 13 Y (out)

## 74HC04D
designator U?
IC INVERTER HEX TTL/LSTTL 14SOIC
footprint SOIC-14 (SOIC, 14-Leads, Body 8.6x3.9mm (max), Pitch 1.27mm, IPC Medium Density)
pins on every part: 7 GND (power) hidden to GND, 14 VCC (power) hidden to VCC
part A pins: 1 A1 (in), 2 Y1 (out)
part B pins: 3 A2 (in), 4 Y2 (out)
part C pins: 5 A3 (in), 6 Y3 (out)
part D pins: 8 Y4 (out), 9 A4 (in)
part E pins: 10 Y5 (out), 11 A5 (in)
part F pins: 12 Y6 (out), 13 A6 (in)

## 74LVC1G14
designator U?
IC SNGL SCHMITT TRIG INV 5TSOP
footprint SOT-23-5 (SOT23, 5-Leads, Body 3.0x3.0mm (max), Pitch 0.95mm, IPC Medium Density)
pins: 1 NC hidden, 2 A, 3 GND (power) hidden to GND, 4 Y, 5 VCC (power) hidden to VCC

## AC Soket Panasonic
designator P?, comment AC Socket
AC Soket Panasonic
footprint AC Socket Panasonic (O cam dien panasonic)
pins: 1, 2

## AC-DC 12V3A
designator P?
footprint AC-DC 12V3A (O cam dien panasonic)
footprint AC-DC 12V2A (O cam dien panasonic)
footprint AC-DC 12V1A
pins: 1 AC_IN_L, 2 AC_IN_N, 3 DC_OUT+, 4 DC_OUT-

## AD8232
designator U?
footprint QFN P50 20 AD8232
pins: 0 PAD, 1 HPDRIVE, 2 +IN, 3 –IN, 4 RLDFB, 5 RLD, 6 SW, 7 OPAMP+, 8 REFOUT, 9 OPAMP–, 10 OUT, 11 LOD–, 12 LOD+, 13 ~{SDN}, 14 AC/~{DC}, 15 FR, 16 GND, 17 +VS, 18 REFIN, 19 IAOUT, 20 HPSENSE

## AN6520
designator A?
2.4GHz SMD Multilayer Chip Antenna 6.5x2.2x1.0 mm; BRAND: Rainsun; PACKAGE: 6.5mm(L)X2.2mm(W)X1.0mm(H); PART NO: AN6520; STOCK CODE: AN6520; SUPPLIER: TME; TYPE: SMD
footprint AN6520 (2.4GHz SMD Multilayer Chip Antenna 6.5x2.2x1.0 mm)
pins: 1, 2 hidden

## Antenna PCB 2.4GHz 50ohm
designator A?
TYPE: DNF
footprint Antenna PCB 2.4GHz 50ohm
pins: 1, 2

## ATmega8A-AU
designator U?
8-bit AVR Microcontroller, 8KB Flash, 512 Bytes EEPROM, 1KB SRAM, 32-pin TQFP, Industrial Grade (-40°C to 85°C)
footprint QFP 80P 32 (TQFP, 32-Leads, Body 9.0x9.0mm (max), Pitch 0.80mm, IPC Medium Density)
pins: 1 PD3 (INT1) (io), 2 PD4 (XCK/T0) (io), 3 GND (power), 4 VCC (power), 5 GND (power), 6 VCC (power), 7 PB6 (XTAL1/TOSC1) (io), 8 PB7 (XTAL2/TOSC2) (io), 9 PD5 (T1) (io), 10 PD6 (AIN0) (io), 11 PD7 (AIN1) (io), 12 PB0 (ICP1) (io), 13 PB1 (OC1A) (io), 14 PB2 (~{SS}/OC1B) (io), 15 PB3 (MOSI/OC2) (io), 16 PB4 (MISO) (io), 17 PB5 (SCK) (io), 18 AVCC (power), 19 ADC6 (in), 20 AREF (power), 21 GND (power), 22 ADC7 (in), 23 PC0 (ADC0) (io), 24 PC1 (ADC1) (io), 25 PC2 (ADC2) (io), 26 PC3 (ADC3) (io), 27 PC4 (ADC4/SDA) (io), 28 PC5 (ADC5/SCL) (io), 29 PC6 (~{RESET}) (io), 30 PD0 (RXD) (io), 31 PD1 (TXD) (io), 32 PD2 (INT0) (io)

## Battery Connector iPhone 4 FPC
designator *
footprint CON iPhone 4 Battery (FPC Flex Battery Connector Plug For iPhone 4 4G)
pins: 1 +, 2 NC, 3 NC, 4 -, 5 PAD, 6 PAD